# Altium footprint library ZZQ_PCBLib.PcbLib: 84 footprints (part 1 of 6)
Each footprint in its own frame and in the unit in brackets; x right, y up, seen from the top. Pads: shape width x height; smd on the part's side, far side on the other; paste and mask are expansions set on the pad; w line width, h text height; cw(c..) or ccw(c..) is an arc to the next point about the centre after c.
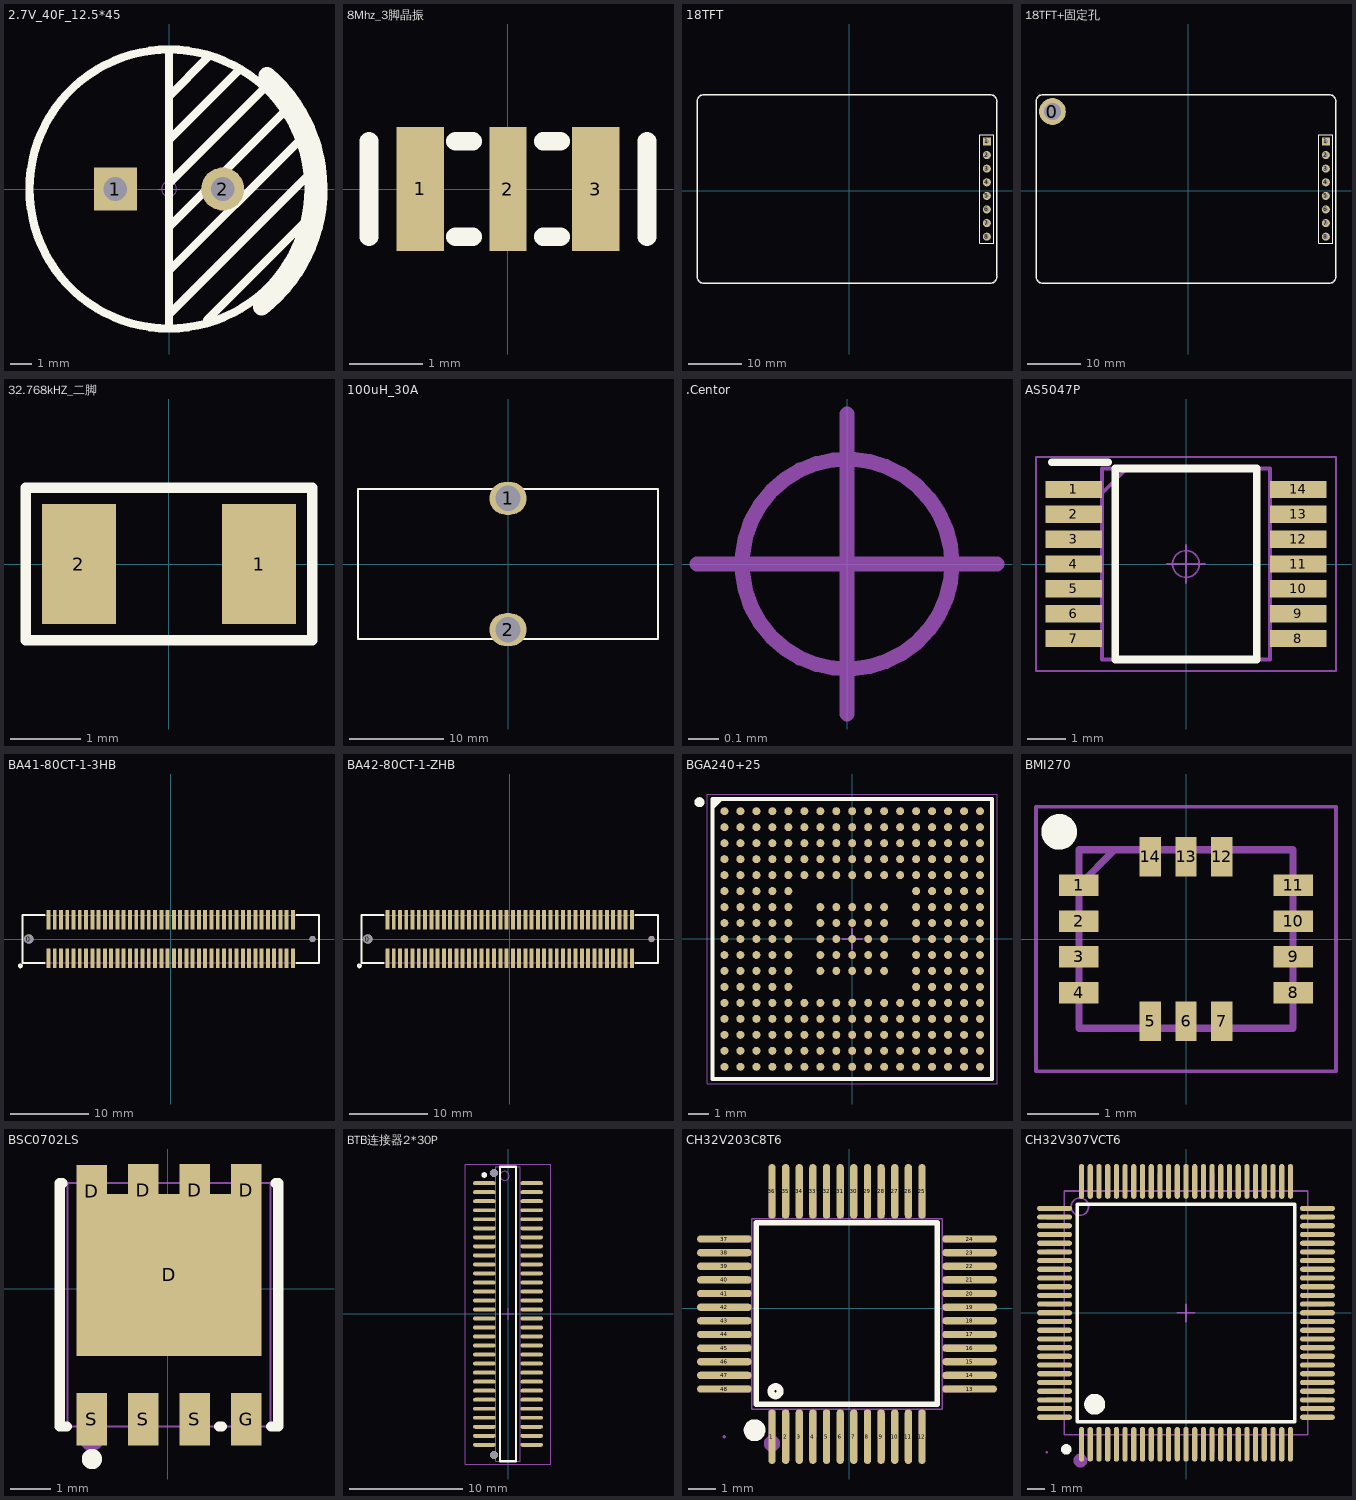
[diagram p0: the footprints below, top view; thin cyan lines are the x and y axes]

## 2.7V_40F_12.5*45 [mm] "超级电容"
pads (2):
  rect 2x2 hole 1.1: 1(-2.5,0)
  round 2 hole 1.1: 2(2.5,0)
Top Overlay:
  circle w0.381: c0,0 r6.5
  lines w0.381: 0,-5.08 0,-3.81 6.096,2.286 ; 0,-2.54 0,-1.778 5.334,3.556 ; 0,0 0,0.254 4.318,4.572 ; 0,1.016 0,2.286 3.302,5.588 ; 0,3.048 0,4.064 ; 0,4.318 1.778,6.096 ; 0,6.35 0,-6.35 0,-5.842 6.35,0.508 ; 1.778,-6.096 6.35,-1.524
  lines w0.8: 4.307,-5.503 ccw(c0,0) 4.568,5.289
Mechanical 15:
  circle w0.05: c0,0 r0.35
  lines w0.05: -0.5,0 0.5,0 ; 0,-0.5 0,0.5
3D body "CE_TH_5x12.5x25-2.STEP": height 2.89, standoff -25.52, extent -6.25,-6.249 6.26,6.249

## 8Mhz_3脚晶振 [mm]
pads (3):
  rect 0.65x1.7 smd: 1(-1.2,0) 3(1.2,0)
  rect 0.5x1.7 smd: 2(0,0)
Top Overlay:
  lines w0.254: -1.9,-0.65 -1.9,0.65 ; -0.718,-0.65 -0.481,-0.65 ; -0.718,0.65 -0.481,0.65 ; 0.481,-0.65 0.718,-0.65 ; 0.481,0.65 0.718,0.65 ; 1.9,-0.65 1.9,0.65
3D body "SMD3213-2.stp": height 0.81, standoff 0, extent -1.597,-0.658 1.598,0.658

## 18TFT [mm]
pads (8):
  rect 1.5x1.5 hole 0.9: 1(25.705,9.246)
  round 1.5 hole 0.9: 2(25.705,6.706) 3(25.705,4.166) 4(25.705,1.626) 5(25.705,-0.914) 6(25.705,-3.454) 7(25.705,-5.994) 8(25.705,-8.534)
Top Overlay:
  lines w0.2: 24.435,-9.804 24.435,10.516 ; 24.435,-9.791 26.975,-9.791 ; 24.435,10.511 26.975,10.511 ; 26.975,-9.804 26.975,10.516
  lines w0.254: -28.397,16.688 cw(c-27.127,16.688) -27.127,17.958 ; -28.397,16.815 -28.397,-15.951 ccw(c-27.127,-15.951) -27.127,-17.221 26.34,-17.221 ccw(c26.34,-15.951) 27.61,-15.951 27.61,16.688 ccw(c26.34,16.688) 26.34,17.958 -27.254,17.958

## 18TFT+固定孔 [mm]
pads (9):
  round 5 hole 3.2: 0(-25.324,14.834)
  rect 1.5x1.5 hole 0.9: 1(25.705,9.246)
  round 1.5 hole 0.9: 2(25.705,6.706) 3(25.705,4.166) 4(25.705,1.626) 5(25.705,-0.914) 6(25.705,-3.454) 7(25.705,-5.994) 8(25.705,-8.534)
Top Overlay:
  lines w0.2: 24.435,-9.804 24.435,10.516 ; 24.435,-9.791 26.975,-9.791 ; 24.435,10.511 26.975,10.511 ; 26.975,-9.804 26.975,10.516
  lines w0.254: -28.397,16.688 cw(c-27.127,16.688) -27.127,17.958 ; -28.397,16.815 -28.397,-15.951 ccw(c-27.127,-15.951) -27.127,-17.221 26.34,-17.221 ccw(c26.34,-15.951) 27.61,-15.951 27.61,16.688 ccw(c26.34,16.688) 26.34,17.958 -27.254,17.958

## 32.768kHZ_二脚 [mm]
height 1.1
pads (2):
  rect 1.05x1.7 smd: 1(1.275,0) 2(-1.275,0)
Top Overlay:
  lines w0.152: -2.029,-1.079 -2.029,1.079 2.029,1.079 2.029,-1.079 -2.029,-1.079

## 100uH_30A [mm] "大电流磁环电感"
pads (2):
  oval 4x3.5 hole 2.7: 1(0,7) 2(0,-7)
Top Overlay:
  lines w0.254: -16,-8 -16,8 16,8 16,-8 -16,-8
3D body: height 32, standoff 0, extent -16.002,-8.001 16.002,8.001

## .Centor [mm]
Mechanical 15:
  circle w0.05: c0,0 r0.35
  lines w0.05: -0.5,0 0.5,0 ; 0,-0.5 0,0.5

## AS5047P [mm]
pads (14):
  rect 1.475x0.45 smd: 1(-2.938,1.95) 2(-2.938,1.3) 3(-2.938,0.65) 4(-2.938,0) 5(-2.938,-0.65) 6(-2.938,-1.3) 7(-2.938,-1.95) 8(2.938,-1.95) 9(2.938,-1.3) 10(2.938,-0.65) 11(2.938,0) 12(2.938,0.65) 13(2.938,1.3) 14(2.938,1.95)
Top Overlay:
  lines w0.2: -3.507,2.667 -2.032,2.667 ; -1.85,-2.5 1.85,-2.5 1.85,2.5 -1.85,2.5 -1.85,-2.5
Mechanical 13:
  lines w0.1: -2.2,1.85 -1.55,2.5 ; -2.2,-2.5 2.2,-2.5 2.2,2.5 -2.2,2.5 -2.2,-2.5
Mechanical 15:
  circle w0.05: c0,0 r0.35
  lines w0.05: -0.5,0 0.5,0 ; 0,-0.5 0,0.5 ; -3.925,-2.8 3.925,-2.8 3.925,2.8 -3.925,2.8 -3.925,-2.8
3D body "AS5047P-ATSM.stp": height 1.2, standoff 0, extent -3.2,-2.5 3.2,2.5

## BA41-80CT-1-3HB [mm]
pads (82):
  round 1.2 hole 1.2: 0(-18.1,0)
  round 0.8 hole 0.8: 0(18.1,0)
  rect 0.5x2.5 smd: 1(-15.6,-2.45) 2(-15.6,2.45) 3(-14.8,-2.45) 4(-14.8,2.45) 5(-14,-2.45) 6(-14,2.45) 7(-13.2,-2.45) 8(-13.2,2.45) 9(-12.4,-2.45) 10(-12.4,2.45) 11(-11.6,-2.45) 12(-11.6,2.45) 13(-10.8,-2.45) 14(-10.8,2.45) 15(-10,-2.45) 16(-10,2.45) 17(-9.2,-2.45) 18(-9.2,2.45) 19(-8.4,-2.45) 20(-8.4,2.45) 21(-7.6,-2.45) 22(-7.6,2.45) 23(-6.8,-2.45) 24(-6.8,2.45) 25(-6,-2.45) 26(-6,2.45) 27(-5.2,-2.45) 28(-5.2,2.45) 29(-4.4,-2.45) 30(-4.4,2.45) 31(-3.6,-2.45) 32(-3.6,2.45) 33(-2.8,-2.45) 34(-2.8,2.45) 35(-2,-2.45) 36(-2,2.45) 37(-1.2,-2.45) 38(-1.2,2.45) 39(-0.4,-2.45) 40(-0.4,2.45) 41(0.4,-2.45) 42(0.4,2.45) 43(1.2,-2.45) 44(1.2,2.45) 45(2,-2.45) 46(2,2.45) 47(2.8,-2.45) 48(2.8,2.45) 49(3.6,-2.45) 50(3.6,2.45) 51(4.4,-2.45) 52(4.4,2.45) 53(5.2,-2.45) 54(5.2,2.45) 55(6,-2.45) 56(6,2.45) 57(6.8,-2.45) 58(6.8,2.45) 59(7.6,-2.45) 60(7.6,2.45) 61(8.4,-2.45) 62(8.4,2.45) 63(9.2,-2.45) 64(9.2,2.45) 65(10,-2.45) 66(10,2.45) 67(10.8,-2.45) 68(10.8,2.45) 69(11.6,-2.45) 70(11.6,2.45) 71(12.4,-2.45) 72(12.4,2.45) 73(13.2,-2.45) 74(13.2,2.45) 75(14,-2.45) 76(14,2.45) 77(14.8,-2.45) 78(14.8,2.45) 79(15.6,-2.45) 80(15.6,2.45)
Top Overlay:
  circle w0.254: c-19.177,-3.429 r0.18
  lines w0.254: -16.081,-3.048 -18.923,-3.048 -18.923,3.048 -16.081,3.048 ; 16.081,-3.048 18.923,-3.048 18.923,3.048 16.081,3.048
Mechanical 15:
  drawing of 85 lines, arcs and shapes, not listed
3D body "BA41.step": height 5.6, standoff -0.6, extent -18.9,-3 18.901,3

## BA42-80CT-1-ZHB [mm]
pads (82):
  round 1.2 hole 1.2: 0(-18.1,0)
  round 0.8 hole 0.8: 0(18.1,0)
  rect 0.5x2.5 smd: 1(-15.6,-2.45) 2(-15.6,2.45) 3(-14.8,-2.45) 4(-14.8,2.45) 5(-14,-2.45) 6(-14,2.45) 7(-13.2,-2.45) 8(-13.2,2.45) 9(-12.4,-2.45) 10(-12.4,2.45) 11(-11.6,-2.45) 12(-11.6,2.45) 13(-10.8,-2.45) 14(-10.8,2.45) 15(-10,-2.45) 16(-10,2.45) 17(-9.2,-2.45) 18(-9.2,2.45) 19(-8.4,-2.45) 20(-8.4,2.45) 21(-7.6,-2.45) 22(-7.6,2.45) 23(-6.8,-2.45) 24(-6.8,2.45) 25(-6,-2.45) 26(-6,2.45) 27(-5.2,-2.45) 28(-5.2,2.45) 29(-4.4,-2.45) 30(-4.4,2.45) 31(-3.6,-2.45) 32(-3.6,2.45) 33(-2.8,-2.45) 34(-2.8,2.45) 35(-2,-2.45) 36(-2,2.45) 37(-1.2,-2.45) 38(-1.2,2.45) 39(-0.4,-2.45) 40(-0.4,2.45) 41(0.4,-2.45) 42(0.4,2.45) 43(1.2,-2.45) 44(1.2,2.45) 45(2,-2.45) 46(2,2.45) 47(2.8,-2.45) 48(2.8,2.45) 49(3.6,-2.45) 50(3.6,2.45) 51(4.4,-2.45) 52(4.4,2.45) 53(5.2,-2.45) 54(5.2,2.45) 55(6,-2.45) 56(6,2.45) 57(6.8,-2.45) 58(6.8,2.45) 59(7.6,-2.45) 60(7.6,2.45) 61(8.4,-2.45) 62(8.4,2.45) 63(9.2,-2.45) 64(9.2,2.45) 65(10,-2.45) 66(10,2.45) 67(10.8,-2.45) 68(10.8,2.45) 69(11.6,-2.45) 70(11.6,2.45) 71(12.4,-2.45) 72(12.4,2.45) 73(13.2,-2.45) 74(13.2,2.45) 75(14,-2.45) 76(14,2.45) 77(14.8,-2.45) 78(14.8,2.45) 79(15.6,-2.45) 80(15.6,2.45)
Top Overlay:
  circle w0.254: c-19.177,-3.429 r0.18
  lines w0.254: -16.081,-3.048 -18.923,-3.048 -18.923,3.048 -16.081,3.048 ; 16.081,-3.048 18.923,-3.048 18.923,3.048 16.081,3.048
Mechanical 15:
  drawing of 85 lines, arcs and shapes, not listed
3D body "BA42.step": height 3.75, standoff -0.6, extent -18.9,-3.4 18.901,3.4

## BGA240+25 [mm]
pads (265):
  round 0.4 smd: A1(-6.4,6.4) A2(-5.6,6.4) A3(-4.8,6.4) A4(-4,6.4) A5(-3.2,6.4) A6(-2.4,6.4) A7(-1.6,6.4) A8(-0.8,6.4) A9(0,6.4) A10(0.8,6.4) A11(1.6,6.4) A12(2.4,6.4) A13(3.2,6.4) A14(4,6.4) A15(4.8,6.4) A16(5.6,6.4) A17(6.4,6.4) B1(-6.4,5.6) B2(-5.6,5.6) B3(-4.8,5.6) B4(-4,5.6) B5(-3.2,5.6) B6(-2.4,5.6) B7(-1.6,5.6) B8(-0.8,5.6) B9(0,5.6) B10(0.8,5.6) B11(1.6,5.6) B12(2.4,5.6) B13(3.2,5.6) B14(4,5.6) B15(4.8,5.6) B16(5.6,5.6) B17(6.4,5.6) C1(-6.4,4.8) C2(-5.6,4.8) C3(-4.8,4.8) C4(-4,4.8) C5(-3.2,4.8) C6(-2.4,4.8) C7(-1.6,4.8) C8(-0.8,4.8) C9(0,4.8) C10(0.8,4.8) C11(1.6,4.8) C12(2.4,4.8) C13(3.2,4.8) C14(4,4.8) C15(4.8,4.8) C16(5.6,4.8) C17(6.4,4.8) D1(-6.4,4) D2(-5.6,4) D3(-4.8,4) D4(-4,4) D5(-3.2,4) D6(-2.4,4) D7(-1.6,4) D8(-0.8,4) D9(0,4) D10(0.8,4) D11(1.6,4) D12(2.4,4) D13(3.2,4) D14(4,4) D15(4.8,4) D16(5.6,4) D17(6.4,4) E1(-6.4,3.2) E2(-5.6,3.2) E3(-4.8,3.2) E4(-4,3.2) E5(-3.2,3.2) E6(-2.4,3.2) E7(-1.6,3.2) E8(-0.8,3.2) E9(0,3.2) E10(0.8,3.2) E11(1.6,3.2) E12(2.4,3.2) E13(3.2,3.2) E14(4,3.2) E15(4.8,3.2) E16(5.6,3.2) E17(6.4,3.2) F1(-6.4,2.4) F2(-5.6,2.4) F3(-4.8,2.4) F4(-4,2.4) F5(-3.2,2.4) F13(3.2,2.4) F14(4,2.4) F15(4.8,2.4) F16(5.6,2.4) F17(6.4,2.4) G1(-6.4,1.6) G2(-5.6,1.6) G3(-4.8,1.6) G4(-4,1.6) G5(-3.2,1.6) G7(-1.6,1.6) G8(-0.8,1.6) G9(0,1.6) G10(0.8,1.6) G11(1.6,1.6) G13(3.2,1.6) G14(4,1.6) G15(4.8,1.6) G16(5.6,1.6) G17(6.4,1.6) H1(-6.4,0.8) H2(-5.6,0.8) H3(-4.8,0.8) H4(-4,0.8) H5(-3.2,0.8) H7(-1.6,0.8) H8(-0.8,0.8) H9(0,0.8) H10(0.8,0.8) H11(1.6,0.8) H13(3.2,0.8) H14(4,0.8) H15(4.8,0.8) H16(5.6,0.8) H17(6.4,0.8) J1(-6.4,0) J2(-5.6,0) J3(-4.8,0) J4(-4,0) J5(-3.2,0) J7(-1.6,0) J8(-0.8,0) J9(0,0) J10(0.8,0) J11(1.6,0) J13(3.2,0) J14(4,0) J15(4.8,0) J16(5.6,0) J17(6.4,0) K1(-6.4,-0.8) K2(-5.6,-0.8) K3(-4.8,-0.8) K4(-4,-0.8) K5(-3.2,-0.8) K7(-1.6,-0.8) K8(-0.8,-0.8) K9(0,-0.8) K10(0.8,-0.8) K11(1.6,-0.8) K13(3.2,-0.8) K14(4,-0.8) K15(4.8,-0.8) K16(5.6,-0.8) K17(6.4,-0.8) L1(-6.4,-1.6) L2(-5.6,-1.6) L3(-4.8,-1.6) L4(-4,-1.6) L5(-3.2,-1.6) L7(-1.6,-1.6) L8(-0.8,-1.6) L9(0,-1.6) L10(0.8,-1.6) L11(1.6,-1.6) L13(3.2,-1.6) L14(4,-1.6) L15(4.8,-1.6) L16(5.6,-1.6) L17(6.4,-1.6) M1(-6.4,-2.4) M2(-5.6,-2.4) M3(-4.8,-2.4) M4(-4,-2.4) M5(-3.2,-2.4) M13(3.2,-2.4) M14(4,-2.4) M15(4.8,-2.4) M16(5.6,-2.4) M17(6.4,-2.4) N1(-6.4,-3.2) N2(-5.6,-3.2) N3(-4.8,-3.2) N4(-4,-3.2) N5(-3.2,-3.2) N6(-2.4,-3.2) N7(-1.6,-3.2) N8(-0.8,-3.2) N9(0,-3.2) N10(0.8,-3.2) N11(1.6,-3.2) N12(2.4,-3.2) N13(3.2,-3.2) N14(4,-3.2) N15(4.8,-3.2) N16(5.6,-3.2) N17(6.4,-3.2) P1(-6.4,-4) P2(-5.6,-4) P3(-4.8,-4) P4(-4,-4) P5(-3.2,-4) P6(-2.4,-4) P7(-1.6,-4) P8(-0.8,-4) P9(0,-4) P10(0.8,-4) P11(1.6,-4) P12(2.4,-4) P13(3.2,-4) P14(4,-4) P15(4.8,-4) P16(5.6,-4) P17(6.4,-4) R1(-6.4,-4.8) R2(-5.6,-4.8) R3(-4.8,-4.8) R4(-4,-4.8) R5(-3.2,-4.8) R6(-2.4,-4.8) R7(-1.6,-4.8) R8(-0.8,-4.8) R9(0,-4.8) R10(0.8,-4.8) R11(1.6,-4.8) R12(2.4,-4.8) R13(3.2,-4.8) R14(4,-4.8) R15(4.8,-4.8) R16(5.6,-4.8) R17(6.4,-4.8) T1(-6.4,-5.6) T2(-5.6,-5.6) T3(-4.8,-5.6) T4(-4,-5.6) T5(-3.2,-5.6) T6(-2.4,-5.6) T7(-1.6,-5.6) T8(-0.8,-5.6) T9(0,-5.6) T10(0.8,-5.6) T11(1.6,-5.6) T12(2.4,-5.6) T13(3.2,-5.6) T14(4,-5.6) T15(4.8,-5.6) T16(5.6,-5.6) T17(6.4,-5.6) U1(-6.4,-6.4) U2(-5.6,-6.4) U3(-4.8,-6.4) U4(-4,-6.4) U5(-3.2,-6.4) U6(-2.4,-6.4) U7(-1.6,-6.4) U8(-0.8,-6.4) U9(0,-6.4) U10(0.8,-6.4) U11(1.6,-6.4) U12(2.4,-6.4) U13(3.2,-6.4) U14(4,-6.4) U15(4.8,-6.4) U16(5.6,-6.4) U17(6.4,-6.4)
Top Overlay:
  circle w0.25: c-7.65,6.85 r0.125
  region: -6.578,7 -7,6.578 -7,7
  lines w0.2: -7,6.578 -6.578,7 ; -7,-7 7,-7 7,7 -7,7 -7,-7
Mechanical 13:
  lines w0.1: -7,-7 7,-7 7,7 -7,7 -7,-7
Mechanical 15:
  lines w0.05: -7.25,-7.25 7.25,-7.25 7.25,7.25 -7.25,7.25 -7.25,-7.25
  lines w0.1: -0.5,0 0.5,0 ; 0,-0.5 0,0.5
3D body: height 1.1, standoff 0.15, extent -7,-7 7,7

## BMI270 [mm]
pads (14):
  rect 0.55x0.3 smd: 1(-1.5,0.75) 2(-1.5,0.25) 3(-1.5,-0.25) 4(-1.5,-0.75) 8(1.5,-0.75) 9(1.5,-0.25) 10(1.5,0.25) 11(1.5,0.75)
  rect 0.3x0.55 smd: 5(-0.5,-1.15) 6(0,-1.15) 7(0.5,-1.15) 12(0.5,1.15) 13(0,1.15) 14(-0.5,1.15)
Top Overlay:
  circle w0.25: c-1.775,1.5 r0.125
Mechanical 13:
  lines w0.1: -1.5,0.75 -1,1.25 ; -1.5,-1.25 -1.5,1.25 1.5,1.25 1.5,-1.25 -1.5,-1.25
Mechanical 15:
  lines w0.05: -2.1,-1.85 -2.1,1.85 2.1,1.85 2.1,-1.85 -2.1,-1.85
3D body "BMI270.stp": height 0.87, standoff 0, extent -1.55,-1.3 1.55,1.3

## BSC0702LS [mil]
pads (9):
  rect 29.5x51.2 smd mask+2: D(-74,94.4) D(-24,95.4) D(26,95.4) D(76,95.4) G(76,-126.6) S(-74,-126.6) S(-24,-126.6) S(26,-126.6)
  rect 179.53x157.48 smd mask+2: D(1,13.4)
Top Overlay:
  circle w10: c-73.8,-165.2 r4.8
  lines w10: -102.6,102.4 -105,102.4 -105,-133.6 -97.85,-133.6 ; 49.85,-133.6 52.15,-133.6 ; 99.85,-133.6 107,-133.6 107,102.4 104.6,102.4
Top Paste:
  region: 40.75,92.14 40.75,121 11.25,121 11.25,92.14 -9.25,92.14 -9.25,121 -38.75,121 -38.75,92.14 -59.25,92.14 -59.25,120 -88.75,120 -88.75,92.14 -88.76,92.14 -88.76,-65.34 90.77,-65.34 90.77,92.14 90.75,92.14 90.75,121 61.25,121 61.25,92.14
  region: 61.25,-101 61.25,-152.2 90.75,-152.2 90.75,-101
  region: -59.25,-152.2 -59.25,-101 -88.75,-101 -88.75,-152.2
  region: 11.25,-101 11.25,-152.2 40.75,-152.2 40.75,-101
  region: -38.75,-101 -38.75,-152.2 -9.25,-152.2 -9.25,-101
Mechanical 6:
  circle w11.81: c-74,-145.6 r5.91
Mechanical 15:
  region: -95.06,-133.71 -95.06,-132.73 -96.45,-131.35 -98.4,-131.35 -99.79,-132.73 -99.79,-133.71 -99.79,-134.69 -98.4,-136.07 -96.45,-136.07 -95.06,-134.69
  region: 85.64,83.61 85.64,-58.12 -83.65,-58.12 -83.65,83.61
  region: -82.66,80.86 -82.66,102.51 -65.34,102.51 -65.34,80.86
  region: -32.66,80.86 -32.66,102.51 -15.34,102.51 -15.34,80.86
  region: 17.34,80.86 17.34,102.51 34.66,102.51 34.66,80.86
  region: 67.34,80.86 67.34,102.51 84.66,102.51 84.66,80.86
  region: 84.66,-112.05 84.66,-133.71 67.34,-133.71 67.34,-112.05
  region: 34.66,-112.05 34.66,-133.71 17.34,-133.71 17.34,-112.05
  region: -15.34,-112.05 -15.34,-133.71 -32.66,-133.71 -32.66,-112.05
  region: -65.34,-112.05 -65.34,-133.71 -82.66,-133.71 -82.66,-112.05
  lines w2: -97.42,-133.71 -97.42,102.51 99.42,102.51 99.42,-133.71 -97.42,-133.71
3D body "TPH1R403NL,L1Q.stp": height 43.31, standoff 0, extent -98.43,-149.53 98.43,117.4

## BTB连接器2*30P [mm] "0.8间距2x30P公座，SMD"
height 2
pads (60):
  oval 2x0.35 smd: 1(-2.1,11.6) 2(-2.1,10.8) 3(-2.1,10) 4(-2.1,9.2) 5(-2.1,8.4) 6(-2.1,7.6) 7(-2.1,6.8) 8(-2.1,6) 9(-2.1,5.2) 10(-2.1,4.4) 11(-2.1,3.6) 12(-2.1,2.8) 13(-2.1,2) 14(-2.1,1.2) 15(-2.1,0.4) 16(-2.1,-0.4) 17(-2.1,-1.2) 18(-2.1,-2) 19(-2.1,-2.8) 20(-2.1,-3.6) 21(-2.1,-4.4) 22(-2.1,-5.2) 23(-2.1,-6) 24(-2.1,-6.8) 25(-2.1,-7.6) 26(-2.1,-8.4) 27(-2.1,-9.2) 28(-2.1,-10) 29(-2.1,-10.8) 30(-2.1,-11.6) 31(2.1,-11.6) 32(2.1,-10.8) 33(2.1,-10) 34(2.1,-9.2) 35(2.1,-8.4) 36(2.1,-7.6) 37(2.1,-6.8) 38(2.1,-6) 39(2.1,-5.2) 40(2.1,-4.4) 41(2.1,-3.6) 42(2.1,-2.8) 43(2.1,-2) 44(2.1,-1.2) 45(2.1,-0.4) 46(2.1,0.4) 47(2.1,1.2) 48(2.1,2) 49(2.1,2.8) 50(2.1,3.6) 51(2.1,4.4) 52(2.1,5.2) 53(2.1,6) 54(2.1,6.8) 55(2.1,7.6) 56(2.1,8.4) 57(2.1,9.2) 58(2.1,10) 59(2.1,10.8) 60(2.1,11.6)
via -1.25,-12.5 diameter 0.7 hole 0.7
via -1.25,12.5 diameter 0.7 hole 0.7
Top Overlay:
  circle w0.25: c-2.1,12.325 r0.125
  lines w0.2: -0.7,-13.05 -0.7,13.05 0.7,13.05 0.7,-13.05 -0.7,-13.05
Mechanical 13:
  circle w0.1: c-0.3,12.25 r0.4
  lines w0.1: -1.1,-13.05 -1.1,13.05 1.1,13.05 1.1,-13.05 -1.1,-13.05
Mechanical 15:
  lines w0.05: -3.8,-13.3 -3.8,13.3 3.8,13.3 3.8,-13.3 -3.8,-13.3
  lines w0.1: -0.5,0 0.5,0 ; 0,-0.5 0,0.5
3D body: height 2, standoff 0.1, extent -1.1,-13.05 1.1,13.05

## CH32V203C8T6 [mm]
pads (48):
  oval 0.27x2 smd paste+0 mask+0.05: 1(-2.83,-4.707) 2(-2.33,-4.707) 3(-1.83,-4.707) 4(-1.33,-4.707) 5(-0.83,-4.707) 6(-0.33,-4.707) 7(0.17,-4.707) 8(0.67,-4.707) 9(1.17,-4.707) 10(1.67,-4.707) 11(2.17,-4.707) 12(2.67,-4.707) 25(2.67,4.293) 26(2.17,4.293) 27(1.67,4.293) 28(1.17,4.293) 29(0.67,4.293) 30(0.17,4.293) 31(-0.33,4.293) 32(-0.83,4.293) 33(-1.33,4.293) 34(-1.83,4.293) 35(-2.33,4.293) 36(-2.83,4.293)
  oval 2x0.27 smd paste+0 mask+0.05: 13(4.42,-2.957) 14(4.42,-2.457) 15(4.42,-1.957) 16(4.42,-1.457) 17(4.42,-0.957) 18(4.42,-0.457) 19(4.42,0.043) 20(4.42,0.543) 21(4.42,1.043) 22(4.42,1.543) 23(4.42,2.043) 24(4.42,2.543) 37(-4.58,2.543) 38(-4.58,2.043) 39(-4.58,1.543) 40(-4.58,1.043) 41(-4.58,0.543) 42(-4.58,0.043) 43(-4.58,-0.457) 44(-4.58,-0.957) 45(-4.58,-1.457) 46(-4.58,-1.957) 47(-4.58,-2.457) 48(-4.58,-2.957)
Top Overlay:
  circle w0.254: c-2.7,-3.037 r0.17
  lines w0.2: -2.976,3.133 3.222,3.133 3.222,-3.522 -3.407,-3.522 -3.407,3.133 -2.645,3.133
  lines w0.4: -3.47,-4.267 ccw(c-3.469,-4.467) -3.468,-4.267
Mechanical 6:
  circle w0.3: c-2.83,-4.957 r0.15
Mechanical 15:
  drawing of 101 lines, arcs and shapes, not listed

## CH32V307VCT6 [mm]
pads (100):
  oval 0.3x2 smd paste-100 mask+0.051: 1(-6,-7.55) 2(-5.5,-7.55) 3(-5,-7.55) 4(-4.5,-7.55) 5(-4,-7.55) 6(-3.5,-7.55) 7(-3,-7.55) 8(-2.5,-7.55) 9(-2,-7.55) 10(-1.5,-7.55) 11(-1,-7.55) 12(-0.5,-7.55) 13(0,-7.55) 14(0.5,-7.55) 15(1,-7.55) 16(1.5,-7.55) 17(2,-7.55) 18(2.5,-7.55) 19(3,-7.55) 20(3.5,-7.55) 21(4,-7.55) 22(4.5,-7.55) 23(5,-7.55) 24(5.5,-7.55) 25(6,-7.55) 51(6,7.55) 52(5.5,7.55) 53(5,7.55) 54(4.5,7.55) 55(4,7.55) 56(3.5,7.55) 57(3,7.55) 58(2.5,7.55) 59(2,7.55) 60(1.5,7.55) 61(1,7.55) 62(0.5,7.55) 63(0,7.55) 64(-0.5,7.55) 65(-1,7.55) 66(-1.5,7.55) 67(-2,7.55) 68(-2.5,7.55) 69(-3,7.55) 70(-3.5,7.55) 71(-4,7.55) 72(-4.5,7.55) 73(-5,7.55) 74(-5.5,7.55) 75(-6,7.55)
  oval 2x0.3 smd paste-100 mask+0.051: 26(7.55,-6) 27(7.55,-5.5) 28(7.55,-5) 29(7.55,-4.5) 30(7.55,-4) 31(7.55,-3.5) 32(7.55,-3) 33(7.55,-2.5) 34(7.55,-2) 35(7.55,-1.5) 36(7.55,-1) 37(7.55,-0.5) 38(7.55,0) 39(7.55,0.5) 40(7.55,1) 41(7.55,1.5) 42(7.55,2) 43(7.55,2.5) 44(7.55,3) 45(7.55,3.5) 46(7.55,4) 47(7.55,4.5) 48(7.55,5) 49(7.55,5.5) 50(7.55,6) 76(-7.55,6) 77(-7.55,5.5) 78(-7.55,5) 79(-7.55,4.5) 80(-7.55,4) 81(-7.55,3.5) 82(-7.55,3) 83(-7.55,2.5) 84(-7.55,2) 85(-7.55,1.5) 86(-7.55,1) 87(-7.55,0.5) 88(-7.55,0) 89(-7.55,-0.5) 90(-7.55,-1) 91(-7.55,-1.5) 92(-7.55,-2) 93(-7.55,-2.5) 94(-7.55,-3) 95(-7.55,-3.5) 96(-7.55,-4) 97(-7.55,-4.5) 98(-7.55,-5) 99(-7.55,-5.5) 100(-7.55,-6)
Top Overlay:
  lines w0.2: -6.25,-6.25 -6.25,6.25 6.25,6.25 6.25,-6.25 -6.25,-6.25
  lines w0.3: -6.883,-7.696 ccw(c-6.882,-7.846) -6.881,-7.696
  lines w0.6: -5.25,-4.95 ccw(c-5.248,-5.251) -5.245,-4.95
Top Paste:
  drawing of 100 lines, arcs and shapes, not listed
Mechanical 6:
  circle w0.4: c-6.071,-8.484 r0.2
Mechanical 13:
  circle w0.1: c-6.1,6.1 r0.5
  lines w0.1: -7,-7 7,-7 7,7 -7,7 -7,-7
Mechanical 15:
  drawing of 207 lines, arcs and shapes, not listed
3D body "LQFP100-14x14.STEP": height 1.45, standoff 0, extent -8.003,-8.003 8.003,8.003